# Altium footprint library ICs And Semiconductors THD.PcbLib: 292 footprints (part 1 of 19) (continued)
## APEX_PA94_hflip [mm] "Power SIP, DQ Package Style, Pitch 2.54mm, Reverse Right Angle Formed Original Straight Leads For Flipped  Horizontal Mount" (continued)
Notvisible:
  circle w0.1: c0,21 r2.75
  circle w0.1: c13.97,0 r1
  circle w0.1: c11.43,0 r1
  circle w0.1: c6.35,0 r1
  circle w0.1: c1.27,0 r1
  circle w0.1: c-1.27,0 r1
  circle w0.1: c-3.81,0 r1
  circle w0.1: c-8.89,0 r1
  circle w0.1: c-13.97,0 r1
  lines w0.1: -14.42,0 -13.97,0 -13.97,-0.45 ; -9.34,0 -8.89,0 -8.89,-0.45 ; -4.26,0 -3.81,0 -3.81,-0.45 ; -1.72,0 -1.27,0 -1.27,-0.45 ; -1,21 0,21 0,20 ; 0.82,0 1.27,0 1.27,-0.45 ; 5.9,0 6.35,0 6.35,-0.45 ; 10.98,0 11.43,0 11.43,-0.45 ; 13.52,0 13.97,0 13.97,-0.45
  text "! USED WITH HEAT SINK AND SOCKET !" at -13.97,10.795 h1
Mechanical 14:
  circle w0.3: c13.97,1.905 r0.15
  lines w0.1: -15.24,4.592 -15.24,1.721 -14.605,1.721 ; -14.478,4.592 -14.478,3.423 -14.605,3.017 -14.605,1.226 -14.36,0.981 cw(c-14.719,0.622) -14.211,0.622 -14.211,-0.216 -13.729,-0.216 -13.729,0.622 cw(c-13.221,0.622) -13.58,0.981 -13.335,1.226 -13.335,3.017 -13.462,3.423 -13.462,4.592 ; -13.335,1.721 -9.525,1.721 ; -9.398,4.592 -9.398,3.423 -9.525,3.017 -9.525,1.226 -9.28,0.981 cw(c-9.639,0.622) -9.131,0.622 -9.131,-0.216 -8.649,-0.216 -8.649,0.622 cw(c-8.141,0.622) -8.5,0.981 -8.255,1.226 -8.255,3.017 -8.382,3.423 -8.382,4.592 ; -8.255,1.721 -4.445,1.721 ; -4.318,4.592 -4.318,3.423 -4.445,3.017 -4.445,1.226 -4.2,0.981 cw(c-4.559,0.622) -4.051,0.622 -4.051,-0.216 -3.569,-0.216 -3.569,0.622 cw(c-3.061,0.622) -3.42,0.981 -3.175,1.226 -3.175,3.017 -3.302,3.423 -3.302,4.592 ; -3.175,1.721 -1.905,1.721 ; -1.778,4.592 -1.778,3.423 -1.905,3.017 -1.905,1.226 -1.66,0.981 cw(c-2.019,0.622) -1.511,0.622 -1.511,-0.216 -1.029,-0.216 -1.029,0.622 cw(c-0.521,0.622) -0.88,0.981 -0.635,1.226 -0.635,3.017 -0.762,3.423 -0.762,4.592 ; -0.635,1.721 0.635,1.721 ; 0.762,4.592 0.762,3.423 0.635,3.017 0.635,1.226 0.88,0.981 cw(c0.521,0.622) 1.029,0.622 1.029,-0.216 1.511,-0.216 1.511,0.622 cw(c2.019,0.622) 1.66,0.981 1.905,1.226 1.905,3.017 1.778,3.423 1.778,4.592 ; 1.905,1.721 5.715,1.721 ; 5.842,4.592 5.842,3.423 5.715,3.017 5.715,1.226 5.96,0.981 cw(c5.601,0.622) 6.109,0.622 6.109,-0.216 6.591,-0.216 6.591,0.622 cw(c7.099,0.622) 6.74,0.981 6.985,1.226 6.985,3.017 6.858,3.423 6.858,4.592 ; 6.985,1.721 10.795,1.721 ; 10.922,4.592 10.922,3.423 10.795,3.017 10.795,1.226 11.04,0.981 cw(c10.681,0.622) 11.189,0.622 11.189,-0.216 11.671,-0.216 11.671,0.622 cw(c12.179,0.622) 11.82,0.981 12.065,1.226 12.065,3.017 11.938,3.423 11.938,4.592 ; 12.065,1.721 13.335,1.721 ; 13.462,4.592 13.462,3.423 13.335,3.017 13.335,1.226 13.58,0.981 cw(c13.221,0.622) 13.729,0.622 13.729,-0.216 14.211,-0.216 14.211,0.622 cw(c14.719,0.622) 14.36,0.981 14.605,1.226 14.605,3.017 14.478,3.423 14.478,4.592 ; 14.605,1.721 15.24,1.721 15.24,4.592 ; -15.494,4.592 15.494,4.592 15.494,16.657 14.732,16.657 cw(c14.732,17.419) 13.97,17.419 13.97,17.774 2.535,23.6 ccw(c2.362,23.261) 1.981,23.261 1.981,21 cw(c0,21) -1.981,21 -1.981,23.261 ccw(c-2.362,23.261) -2.535,23.6 -13.97,17.774 -13.97,17.419 cw(c-14.732,17.419) -14.732,16.657 -15.494,16.657 -15.494,4.592 ; 13.093,5.608 13.785,6.878 14.478,5.608 13.093,5.608
3D body "APEX_PA94_hflip.stp": height 7, standoff -2.84, extent -15.494,-0.216 15.494,23.641

## APEX_PA94_v [mm] "Power SIP, DQ Package Style, Pitch 2.54mm, Straight Leads For Vertical Mount"
height 23.14
pads (8):
  round 1.6 hole 0.9: 1(-13.97,0) 2(-11.43,0) 4(-6.35,0) 6(-1.27,0) 7(1.27,0) 8(3.81,0) 10(8.89,0) 12(13.97,0)
Top Overlay:
  circle w0.3: c-13.97,-1.905 r0.15
  lines w0.2: -15.494,1.118 15.494,1.118 ; -15.494,2.134 15.494,2.134 ; -15.24,-2.616 -15.24,-2.87 15.24,-2.87 15.24,-2.616 ; -1.981,2.134 -1.981,3.988 ; 1.981,2.134 1.981,3.988 ; -15.494,-2.616 -15.494,3.988 15.494,3.988 15.494,-2.616 -15.494,-2.616
Notvisible:
  lines w0.1: -14.97,0 -13.97,0 -13.97,-1 ; -14.211,-0.216 -14.211,0.216 ; -13.729,-0.216 -13.729,0.216 ; -12.43,0 -11.43,0 -11.43,-1 ; -11.671,-0.216 -11.671,0.216 ; -11.189,-0.216 -11.189,0.216 ; -7.35,0 -6.35,0 -6.35,-1 ; -6.591,-0.216 -6.591,0.216 ; -6.109,-0.216 -6.109,0.216 ; -2.27,0 -1.27,0 -1.27,-1 ; -1.511,-0.216 -1.511,0.216 ; -1.029,-0.216 -1.029,0.216 ; 0.27,0 1.27,0 1.27,-1 ; 1.029,-0.216 1.029,0.216 ; 1.511,-0.216 1.511,0.216 ; 2.81,0 3.81,0 3.81,-1 ; 3.569,-0.216 3.569,0.216 ; 4.051,-0.216 4.051,0.216 ; 7.89,0 8.89,0 8.89,-1 ; 8.649,-0.216 8.649,0.216 ; 9.131,-0.216 9.131,0.216 ; 12.97,0 13.97,0 13.97,-1 ; 13.729,-0.216 13.729,0.216 ; 14.211,-0.216 14.211,0.216 ; -14.605,-0.216 -14.605,0.216 -13.335,0.216 -13.335,-0.216 -14.605,-0.216 ; -12.065,-0.216 -12.065,0.216 -10.795,0.216 -10.795,-0.216 -12.065,-0.216 ; -6.985,-0.216 -6.985,0.216 -5.715,0.216 -5.715,-0.216 -6.985,-0.216 ; -1.905,-0.216 -1.905,0.216 -0.635,0.216 -0.635,-0.216 -1.905,-0.216 ; 0.635,-0.216 0.635,0.216 1.905,0.216 1.905,-0.216 0.635,-0.216 ; 3.175,-0.216 3.175,0.216 4.445,0.216 4.445,-0.216 3.175,-0.216 ; 8.255,-0.216 8.255,0.216 9.525,0.216 9.525,-0.216 8.255,-0.216 ; 13.335,-0.216 13.335,0.216 14.605,0.216 14.605,-0.216 13.335,-0.216
Mechanical 14:
  circle w0.3: c-13.97,-1.905 r0.15
  lines w0.1: -15.494,1.118 15.494,1.118 ; -15.494,2.134 15.494,2.134 ; -15.24,-2.616 -15.24,-2.87 15.24,-2.87 15.24,-2.616 ; -1.981,2.134 -1.981,3.988 ; 1.981,2.134 1.981,3.988 ; -15.494,-2.616 -15.494,3.988 15.494,3.988 15.494,-2.616 -15.494,-2.616
3D body "APEX_PA94_v.stp": height 23.14, standoff -3.1, extent -15.494,-2.87 15.494,3.988

## CDIP8-300 [mm] "DIP 8 Leads, Row Spacing 7.62 mm; Pitch 2.54 mm"
height 5.08
pads (8):
  rect 1.6x1.6 hole 0.9: 1(-3.81,3.81)
  round 1.6 hole 0.9: 2(-3.81,1.27) 3(-3.81,-1.27) 4(-3.81,-3.81) 5(3.81,-3.81) 6(3.81,-1.27) 7(3.81,1.27) 8(3.81,3.81)
Top Overlay:
  lines w0.2: -0.635,5.15 ccw(c0,5.15) 0.635,5.15 ; -0.635,5.15 ccw(c0,5.15) 0.635,5.15 ; -0.635,5.15 -2.65,5.15 -2.65,-5.15 2.65,-5.15 2.65,5.15 0.635,5.15
Mechanical 14:
  circle w0.1: c-1.905,3.81 r0.254
  lines w0.1: -3.3,-5.15 3.3,-5.15 3.3,5.15 0.635,5.15 cw(c0,5.15) -0.635,5.15 -3.3,5.15 -3.3,-5.15
3D body "CDIP8-300.stp": height 5.34, standoff -5.08, extent -4.04,-5.08 4.04,5.08

## CDIP28-600 [mm] "28 Leads Ceramic Dual In-Line Package Q-28-2, Row Spacing 15.24mm; Pitch 2.54mm"
height 5.59
pads (28):
  rect 1.6x1.6 hole 0.9: 1(-7.62,16.51)
  round 1.6 hole 0.9: 2(-7.62,13.97) 3(-7.62,11.43) 4(-7.62,8.89) 5(-7.62,6.35) 6(-7.62,3.81) 7(-7.62,1.27) 8(-7.62,-1.27) 9(-7.62,-3.81) 10(-7.62,-6.35) 11(-7.62,-8.89) 12(-7.62,-11.43) 13(-7.62,-13.97) 14(-7.62,-16.51) 15(7.62,-16.51) 16(7.62,-13.97) 17(7.62,-11.43) 18(7.62,-8.89) 19(7.62,-6.35) 20(7.62,-3.81) 21(7.62,-1.27) 22(7.62,1.27) 23(7.62,3.81) 24(7.62,6.35) 25(7.62,8.89) 26(7.62,11.43) 27(7.62,13.97) 28(7.62,16.51)
Top Overlay:
  lines w0.2: -6.35,-18.925 -6.35,18.925 -0.635,18.925 ccw(c0,18.925) 0.635,18.925 6.35,18.925 6.35,-18.925 -6.35,-18.925
Mechanical 14:
  lines w0.1: -6.35,-18.925 -6.35,18.925 -0.635,18.925 ccw(c0,18.925) 0.635,18.925 6.35,18.925 6.35,-18.925 -6.35,-18.925
3D body "CERDIP28-600.stp": height 5.72, standoff -5.08, extent -7.85,-18.925 7.85,18.925

## CDIP40-600_WINDOW [mm] "40 Leads Dual In-Line Package, Row Spacing 15.24mm; Pitch 2.54mm"
height 5.72
pads (40):
  rect 1.6x1.6 hole 0.9: 1(-7.62,24.13)
  round 1.6 hole 0.9: 2(-7.62,21.59) 3(-7.62,19.05) 4(-7.62,16.51) 5(-7.62,13.97) 6(-7.62,11.43) 7(-7.62,8.89) 8(-7.62,6.35) 9(-7.62,3.81) 10(-7.62,1.27) 11(-7.62,-1.27) 12(-7.62,-3.81) 13(-7.62,-6.35) 14(-7.62,-8.89) 15(-7.62,-11.43) 16(-7.62,-13.97) 17(-7.62,-16.51) 18(-7.62,-19.05) 19(-7.62,-21.59) 20(-7.62,-24.13) 21(7.62,-24.13) 22(7.62,-21.59) 23(7.62,-19.05) 24(7.62,-16.51) 25(7.62,-13.97) 26(7.62,-11.43) 27(7.62,-8.89) 28(7.62,-6.35) 29(7.62,-3.81) 30(7.62,-1.27) 31(7.62,1.27) 32(7.62,3.81) 33(7.62,6.35) 34(7.62,8.89) 35(7.62,11.43) 36(7.62,13.97) 37(7.62,16.51) 38(7.62,19.05) 39(7.62,21.59) 40(7.62,24.13)
Top Overlay:
  lines w0.2: -6.35,-26.25 6.35,-26.25 6.35,26.25 0.635,26.25 cw(c0,26.25) -0.635,26.25 -6.35,26.25 -6.35,-26.25
Notvisible:
  drawing of 297 lines, arcs and shapes, not listed
Mechanical 14:
  circle w0.1: c-5.715,24.13 r0.5
  lines w0.1: -7.05,-26.25 7.05,-26.25 7.05,26.25 0.635,26.25 cw(c0,26.25) -0.635,26.25 -7.05,26.25 -7.05,-26.25
3D body "CERDIP40-600_WINDOW.stp": height 5.72, standoff -5.08, extent -7.8,-26.25 7.9,26.35

## CELDUC_SKD10306 [mm] "CELDUC SKD Serie, 4 Leads, Body 43.6 x 10.55mm, DC Solid State Relay"
height 25.75
pads (4):
  round 1.9 hole 1.2: 1(13.97,2.54) 2(3.81,2.54) 3(-8.89,2.54) 4(-13.97,2.54)
Top Overlay:
  lines w0.2: -21.8,-5.275 -21.8,5.275 21.8,5.275 21.8,-5.275 -21.8,-5.275
  text "4-" at -14.902,-0.75 h1.5
  text "3+" at -10.085,-0.75 h1.5
  text "2-" at 2.878,-0.75 h1.5
  text "1+" at 12.775,-0.75 h1.5
Notvisible:
  lines w0.1: -14.47,2.54 -13.97,2.54 ; -13.97,2.04 -13.97,2.54 ; -13.97,3.04 -13.97,2.54 ; -13.47,2.54 -13.97,2.54 ; -9.39,2.54 -8.89,2.54 ; -8.89,2.04 -8.89,2.54 ; -8.89,3.04 -8.89,2.54 ; -8.39,2.54 -8.89,2.54 ; -0.5,0 0,0 ; 0,-0.5 0,0 ; 0,0.5 0,0 ; 0.5,0 0,0 ; 3.31,2.54 3.81,2.54 ; 3.81,2.04 3.81,2.54 ; 3.81,3.04 3.81,2.54 ; 4.31,2.54 3.81,2.54 ; 13.47,2.54 13.97,2.54 ; 13.97,2.04 13.97,2.54 ; 13.97,3.04 13.97,2.54 ; 14.47,2.54 13.97,2.54
Mechanical 14:
  lines w0.1: -21.8,-5.275 21.8,-5.275 21.8,5.275 -21.8,5.275 -21.8,-5.275
  text "1+" at 12.775,-0.75 h1.5
  text "2-" at 2.878,-0.75 h1.5
  text "3+" at -10.085,-0.75 h1.5
  text "4-" at -14.902,-0.75 h1.5
3D body "SKD10306.stp": height 25.75, standoff -3.1, extent -21.8,-5.275 21.8,5.275

## CMOSIS_CMV4000 [mm] "Megapixel machine vision CMOS image sensor"
height 3.58
pads (95):
  round 1 hole 0.5 unplated: A2(-4.445,5.715) A3(-4.445,4.445) A4(-4.445,3.175) A5(-4.445,1.905) A6(-4.445,0.635) A7(-4.445,-0.635) A8(-4.445,-1.905) A9(-4.445,-3.175) A10(-4.445,-4.445) A11(-4.445,-5.715) A12(-4.445,-6.985) B1(-3.175,6.985) B2(-3.175,5.715) B3(-3.175,4.445) B4(-3.175,3.175) B5(-3.175,1.905) B6(-3.175,0.635) B7(-3.175,-0.635) B8(-3.175,-1.905) B9(-3.175,-3.175) B10(-3.175,-4.445) B11(-3.175,-5.715) B12(-3.175,-6.985) C1(-1.905,6.985) C2(-1.905,5.715) C3(-1.905,4.445) C4(-1.905,3.175) C5(-1.905,1.905) C6(-1.905,0.635) C7(-1.905,-0.635) C8(-1.905,-1.905) C9(-1.905,-3.175) C10(-1.905,-4.445) C11(-1.905,-5.715) C12(-1.905,-6.985) D1(-0.635,6.985) D2(-0.635,5.715) D3(-0.635,4.445) D4(-0.635,3.175) D5(-0.635,1.905) D6(-0.635,0.635) D7(-0.635,-0.635) D8(-0.635,-1.905) D9(-0.635,-3.175) D10(-0.635,-4.445) D11(-0.635,-5.715) D12(-0.635,-6.985) E1(0.635,6.985) E2(0.635,5.715) E3(0.635,4.445) E4(0.635,3.175) E5(0.635,1.905) E6(0.635,0.635) E7(0.635,-0.635) E8(0.635,-1.905) E9(0.635,-3.175) E10(0.635,-4.445) E11(0.635,-5.715) E12(0.635,-6.985) F1(1.905,6.985) F2(1.905,5.715) F3(1.905,4.445) F4(1.905,3.175) F5(1.905,1.905) F6(1.905,0.635) F7(1.905,-0.635) F8(1.905,-1.905) F9(1.905,-3.175) F10(1.905,-4.445) F11(1.905,-5.715) F12(1.905,-6.985) G1(3.175,6.985) G2(3.175,5.715) G3(3.175,4.445) G4(3.175,3.175) G5(3.175,1.905) G6(3.175,0.635) G7(3.175,-0.635) G8(3.175,-1.905) G9(3.175,-3.175) G10(3.175,-4.445) G11(3.175,-5.715) G12(3.175,-6.985) H1(4.445,6.985) H2(4.445,5.715) H3(4.445,4.445) H4(4.445,3.175) H5(4.445,1.905) H6(4.445,0.635) H7(4.445,-0.635) H8(4.445,-1.905) H9(4.445,-3.175) H10(4.445,-4.445) H11(4.445,-5.715) H12(4.445,-6.985)
Top Overlay:
  lines w0.2: -5.454,-7.275 -6.825,-7.275 cw(c-6.825,-6.775) -7.325,-6.775 -7.325,6.775 cw(c-6.825,6.775) -6.825,7.275 -5.454,7.275 ; 5.454,-7.275 6.825,-7.275 ccw(c6.825,-6.775) 7.325,-6.775 7.325,6.775 ccw(c6.825,6.775) 6.825,7.275 5.454,7.275 ; 5.5,-5.625 6.145,-5.625 6.145,5.635 5.5,5.635 ; -9.325,-8.881 -8.881,-9.325 8.881,-9.325 9.325,-8.881 9.325,8.881 8.881,9.325 -8.881,9.325 -9.325,8.881 -9.325,-8.881 ; -8.075,-7.525 ccw(c-7.575,-7.525) -7.575,-8.025 7.575,-8.025 ccw(c7.575,-7.525) 8.075,-7.525 8.067,7.438 ccw(c7.575,7.525) 7.575,8.025 -7.575,8.025 ccw(c-7.575,7.525) -8.075,7.525 -8.075,-7.525 ; -7.825,6.97 -7.625,6.97 -7.625,7.27 -7.825,7.27 -7.825,6.97
Notvisible:
  drawing of 387 lines, arcs and shapes, not listed
Mechanical 14:
  lines w0.1: -9.325,-8.881 -8.881,-9.325 8.881,-9.325 9.325,-8.881 9.325,8.881 8.881,9.325 -8.881,9.325 -9.325,8.881 -9.325,-8.881 ; -8.075,-7.525 ccw(c-7.575,-7.525) -7.575,-8.025 7.575,-8.025 ccw(c7.575,-7.525) 8.075,-7.525 8.067,7.438 ccw(c7.575,7.525) 7.575,8.025 -7.575,8.025 ccw(c-7.575,7.525) -8.075,7.525 -8.075,-7.525 ; -7.825,6.97 -7.625,6.97 -7.625,7.27 -7.825,7.27 -7.825,6.97 ; -7.325,-6.775 ccw(c-6.825,-6.775) -6.825,-7.275 6.825,-7.275 ccw(c6.825,-6.775) 7.325,-6.775 7.325,6.775 ccw(c6.825,6.775) 6.825,7.275 -6.825,7.275 ccw(c-6.825,6.775) -7.325,6.775 -7.325,-6.775 ; -5.115,-5.625 -5.115,5.635 6.145,5.635 6.145,-5.625 -5.115,-5.625
3D body "CMOSIS_CMV4000.stp": height 3.58, standoff -2.7, extent -9.42,-9.42 9.42,9.42

## CMOSIS_CMV12000 [mm] "12 Megapixel Machine Vision CMOS Image Sensor"
height 3.78
pads (237):
  round 1 hole 0.5: A2(-14.605,17.145) A3(-14.605,15.875) A4(-14.605,14.605) A5(-14.605,13.335) A6(-14.605,12.065) A7(-14.605,10.795) A8(-14.605,9.525) A9(-14.605,8.255) A10(-14.605,6.985) A11(-14.605,5.715) A12(-14.605,4.445) A13(-14.605,3.175) A14(-14.605,1.905) A15(-14.605,0.635) A16(-14.605,-0.635) A17(-14.605,-1.905) A18(-14.605,-3.175) A19(-14.605,-4.445) A20(-14.605,-5.715) A21(-14.605,-6.985) A22(-14.605,-8.255) A23(-14.605,-9.525) A24(-14.605,-10.795) A25(-14.605,-12.065) A26(-14.605,-13.335) A27(-14.605,-14.605) A28(-14.605,-15.875) A29(-14.605,-17.145) A30(-14.605,-18.415) B1(-13.335,18.415) B2(-13.335,17.145) B3(-13.335,15.875) B4(-13.335,14.605) B5(-13.335,13.335) B6(-13.335,12.065) B7(-13.335,10.795) B8(-13.335,9.525) B9(-13.335,8.255) B10(-13.335,6.985) B11(-13.335,5.715) B12(-13.335,4.445) B13(-13.335,3.175) B14(-13.335,1.905) B15(-13.335,0.635) B16(-13.335,-0.635) B17(-13.335,-1.905) B18(-13.335,-3.175) B19(-13.335,-4.445) B20(-13.335,-5.715) B21(-13.335,-6.985) B22(-13.335,-8.255) B24(-13.335,-10.795) B25(-13.335,-12.065) B26(-13.335,-13.335) B27(-13.335,-14.605) B28(-13.335,-15.875) B29(-13.335,-17.145) B30(-13.335,-18.415) C1(-12.065,18.415) C2(-12.065,17.145) C3(-12.065,15.875) C4(-12.065,14.605) C5(-12.065,13.335) C6(-12.065,12.065) C7(-12.065,10.795) C8(-12.065,9.525) C9(-12.065,8.255) C10(-12.065,6.985) C11(-12.065,5.715) C12(-12.065,4.445) C13(-12.065,3.175) C14(-12.065,1.905) C15(-12.065,0.635) C16(-12.065,-0.635) C17(-12.065,-1.905) C18(-12.065,-3.175) C19(-12.065,-4.445) C20(-12.065,-5.715) C21(-12.065,-6.985) C22(-12.065,-8.255) C24(-12.065,-10.795) C25(-12.065,-12.065) C26(-12.065,-13.335) C27(-12.065,-14.605) C28(-12.065,-15.875) C29(-12.065,-17.145) C30(-12.065,-18.415) D1(-10.795,18.415) D2(-10.795,17.145) D3(-10.795,15.875) D4(-10.795,14.605) D5(-10.795,13.335) D6(-10.795,12.065) D7(-10.795,10.795) D8(-10.795,9.525) D9(-10.795,8.255) D10(-10.795,6.985) D11(-10.795,5.715) D12(-10.795,4.445) D13(-10.795,3.175) D14(-10.795,1.905) D15(-10.795,0.635) D16(-10.795,-0.635) D17(-10.795,-1.905) D18(-10.795,-3.175) D19(-10.795,-4.445) D20(-10.795,-5.715) D21(-10.795,-6.985) D22(-10.795,-8.255) D23(-10.795,-9.525) D24(-10.795,-10.795) D25(-10.795,-12.065) D26(-10.795,-13.335) D27(-10.795,-14.605) D28(-10.795,-15.875) D29(-10.795,-17.145) D30(-10.795,-18.415) E1(10.795,18.415) E2(10.795,17.145) E3(10.795,15.875) E4(10.795,14.605) E5(10.795,13.335) E6(10.795,12.065) E7(10.795,10.795) E8(10.795,9.525) E9(10.795,8.255) E10(10.795,6.985) E11(10.795,5.715) E12(10.795,4.445) E13(10.795,3.175) E14(10.795,1.905) E15(10.795,0.635) E16(10.795,-0.635) E17(10.795,-1.905) E18(10.795,-3.175) E19(10.795,-4.445) E20(10.795,-5.715) E21(10.795,-6.985) E22(10.795,-8.255) E23(10.795,-9.525) E24(10.795,-10.795) E25(10.795,-12.065) E26(10.795,-13.335) E27(10.795,-14.605) E28(10.795,-15.875) E29(10.795,-17.145) E30(10.795,-18.415) F1(12.065,18.415) F2(12.065,17.145) F3(12.065,15.875) F4(12.065,14.605) F5(12.065,13.335) F6(12.065,12.065) F7(12.065,10.795) F8(12.065,9.525) F9(12.065,8.255) F10(12.065,6.985) F11(12.065,5.715) F12(12.065,4.445) F13(12.065,3.175) F14(12.065,1.905) F15(12.065,0.635) F16(12.065,-0.635) F17(12.065,-1.905) F18(12.065,-3.175) F19(12.065,-4.445) F20(12.065,-5.715) F21(12.065,-6.985) F22(12.065,-8.255) F23(12.065,-9.525) F24(12.065,-10.795) F25(12.065,-12.065) F26(12.065,-13.335) F27(12.065,-14.605) F28(12.065,-15.875) F29(12.065,-17.145) F30(12.065,-18.415) G1(13.335,18.415) G2(13.335,17.145) G3(13.335,15.875) G4(13.335,14.605) G5(13.335,13.335) G6(13.335,12.065) G7(13.335,10.795) G8(13.335,9.525) G9(13.335,8.255) G10(13.335,6.985) G11(13.335,5.715) G12(13.335,4.445) G13(13.335,3.175) G14(13.335,1.905) G15(13.335,0.635) G16(13.335,-0.635) G17(13.335,-1.905) G18(13.335,-3.175) G19(13.335,-4.445) G20(13.335,-5.715) G21(13.335,-6.985) G22(13.335,-8.255) G23(13.335,-9.525) G24(13.335,-10.795) G25(13.335,-12.065) G26(13.335,-13.335) G27(13.335,-14.605) G28(13.335,-15.875) G29(13.335,-17.145) G30(13.335,-18.415) H1(14.605,18.415) H2(14.605,17.145) H3(14.605,15.875) H4(14.605,14.605) H5(14.605,13.335) H6(14.605,12.065) H7(14.605,10.795) H8(14.605,9.525) H9(14.605,8.255) H10(14.605,6.985) H11(14.605,5.715) H12(14.605,4.445) H13(14.605,3.175) H14(14.605,1.905) H15(14.605,0.635) H16(14.605,-0.635) H17(14.605,-1.905) H18(14.605,-3.175) H19(14.605,-4.445) H20(14.605,-5.715) H21(14.605,-6.985) H22(14.605,-8.255) H23(14.605,-9.525) H24(14.605,-10.795) H25(14.605,-12.065) H26(14.605,-13.335) H27(14.605,-14.605) H28(14.605,-15.875) H29(14.605,-17.145) H30(14.605,-18.415)
Top Overlay:
  circle w0.2: c-14.9,21.5 r0.5
  lines w0.2: -15.505,-16.85 -16.4,-16.85 -16.4,16.85 -15.505,16.85 ; -12.9,-23.5 -12.9,-19.5 -8.9,-19.5 -8.9,-23.5 ; -12.9,23.5 -12.9,19.5 -8.9,19.5 -8.9,23.5 ; -9.895,-16.85 9.895,-16.85 ; -9.895,-14.35 9.895,-14.35 ; -9.895,-13.6 9.895,-13.6 ; -9.895,13.6 9.895,13.6 ; -9.895,14.35 9.895,14.35 ; -9.895,16.85 9.895,16.85 ; 8.9,-23.5 8.9,-19.5 12.9,-19.5 12.9,-23.5 ; 8.9,23.5 8.9,19.5 12.9,19.5 12.9,23.5 ; 15.505,-16.85 16.4,-16.85 16.4,16.85 15.505,16.85 ; -16.9,-23 -16.9,23 -16.4,23.5 -1.75,23.5 -1.75,21.5 ccw(c0,21.5) 1.75,21.5 1.75,23.5 16.4,23.5 16.9,23 16.9,-23 16.4,-23.5 1.75,-23.5 1.75,-21.5 ccw(c0,-21.5) -1.75,-21.5 -1.75,-23.5 -16.4,-23.5 -16.9,-23 ; -9.895,-13.4 9.895,-13.4 -9.895,-13.4 ; -9.895,11.8 9.895,11.8 -9.895,11.8
Notvisible:
  drawing of 960 lines, arcs and shapes, not listed
Mechanical 14:
  circle w0.1: c-14.9,21.5 r0.5
  lines w0.1: -12.9,-23.5 -12.9,-19.5 -8.9,-19.5 -8.9,-23.5 ; -12.9,23.5 -12.9,19.5 -8.9,19.5 -8.9,23.5 ; -12.4,-13.6 -12.4,13.6 ; -0.354,-1.154 0,-0.8 ; -0.354,-0.446 0,-0.8 ; 0.354,-1.154 0,-0.8 ; 0.354,-0.446 0,-0.8 ; 8.9,-23.5 8.9,-19.5 12.9,-19.5 12.9,-23.5 ; 8.9,23.5 8.9,19.5 12.9,19.5 12.9,23.5 ; 12.4,-13.6 12.4,13.6 ; -11.4,-13.4 11.4,-13.4 ; -11.4,-13.4 -11.4,11.8 ; -11.4,-13.4 11.4,-13.4 ; -11.4,-13.4 -11.4,11.8 ; -11.4,11.8 11.4,11.8 ; -11.4,11.8 11.4,11.8 ; 11.4,-13.4 11.4,11.8 ; 11.4,-13.4 11.4,11.8 ; -16.9,-23 -16.9,23 -16.4,23.5 -1.75,23.5 -1.75,21.5 ccw(c0,21.5) 1.75,21.5 1.75,23.5 16.4,23.5 16.9,23 16.9,-23 16.4,-23.5 1.75,-23.5 1.75,-21.5 ccw(c0,-21.5) -1.75,-21.5 -1.75,-23.5 -16.4,-23.5 -16.9,-23 ; -16.4,-16.85 16.4,-16.85 16.4,16.85 -16.4,16.85 -16.4,-16.85 ; -13.9,-14.35 13.9,-14.35 13.9,14.35 -13.9,14.35 -13.9,-14.35 ; -13.15,-13.6 -13.15,13.6 13.15,13.6 13.15,-13.6 -13.15,-13.6
3D body "CMOSIS_CMV12000.stp": height 3.45, standoff -2.5, extent -16.9,-23.5 16.9,23.5

## CMOSIS_CMV20000 [mm] "20 Megapixel Global Shutter CMOS Image Sensor"
height 5.17
pads (143):
  round 1.65 hole 0.8: A2(-19.05,19.05) A3(-19.05,16.51) A4(-19.05,13.97) A5(-19.05,11.43) A6(-19.05,8.89) A7(-19.05,6.35) A8(-19.05,3.81) A9(-19.05,1.27) A10(-19.05,-1.27) A11(-19.05,-3.81) A12(-19.05,-6.35) A13(-19.05,-8.89) A14(-19.05,-11.43) A15(-19.05,-13.97) A16(-19.05,-16.51) A17(-19.05,-19.05) A18(-19.05,-21.59) B1(-16.51,21.59) B2(-16.51,19.05) B3(-16.51,16.51) B4(-16.51,13.97) B5(-16.51,11.43) B6(-16.51,8.89) B7(-16.51,6.35) B8(-16.51,3.81) B9(-16.51,1.27) B10(-16.51,-1.27) B11(-16.51,-3.81) B12(-16.51,-6.35) B13(-16.51,-8.89) B14(-16.51,-11.43) B15(-16.51,-13.97) B16(-16.51,-16.51) B17(-16.51,-19.05) B18(-16.51,-21.59) C1(-13.97,21.59) C2(-13.97,19.05) C3(-13.97,16.51) C16(-13.97,-16.51) C17(-13.97,-19.05) C18(-13.97,-21.59) D1(-11.43,21.59) D2(-11.43,19.05) D3(-11.43,16.51) D16(-11.43,-16.51) D17(-11.43,-19.05) D18(-11.43,-21.59) E1(-8.89,21.59) E2(-8.89,19.05) E3(-8.89,16.51) E16(-8.89,-16.51) E17(-8.89,-19.05) E18(-8.89,-21.59) F1(-6.35,21.59) F2(-6.35,19.05) F3(-6.35,16.51) F16(-6.35,-16.51) F17(-6.35,-19.05) F18(-6.35,-21.59) G1(-3.81,21.59) G2(-3.81,19.05) G3(-3.81,16.51) G16(-3.81,-16.51) G17(-3.81,-19.05) G18(-3.81,-21.59) H1(-1.27,21.59) H2(-1.27,19.05) H3(-1.27,16.51) H16(-1.27,-16.51) H17(-1.27,-19.05) H18(-1.27,-21.59) J1(1.27,21.59) J2(1.27,19.05) J3(1.27,16.51) J16(1.27,-16.51) J17(1.27,-19.05) J18(1.27,-21.59) K1(3.81,21.59) K2(3.81,19.05) K3(3.81,16.51) K16(3.81,-16.51) K17(3.81,-19.05) K18(3.81,-21.59) L1(6.35,21.59) L2(6.35,19.05) L3(6.35,16.51) L16(6.35,-16.51) L17(6.35,-19.05) L18(6.35,-21.59) M1(8.89,21.59) M2(8.89,19.05) M3(8.89,16.51) M16(8.89,-16.51) M17(8.89,-19.05) M18(8.89,-21.59) N1(11.43,21.59) N2(11.43,19.05) N3(11.43,16.51) N16(11.43,-16.51) N17(11.43,-19.05) N18(11.43,-21.59) P1(13.97,21.59) P2(13.97,19.05) P3(13.97,16.51) P16(13.97,-16.51) P17(13.97,-19.05) P18(13.97,-21.59) R1(16.51,21.59) R2(16.51,19.05) R3(16.51,16.51) R4(16.51,13.97) R5(16.51,11.43) R6(16.51,8.89) R7(16.51,6.35) R8(16.51,3.81) R9(16.51,1.27) R10(16.51,-1.27) R11(16.51,-3.81) R12(16.51,-6.35) R13(16.51,-8.89) R14(16.51,-11.43) R15(16.51,-13.97) R16(16.51,-16.51) R17(16.51,-19.05) R18(16.51,-21.59) T1(19.05,21.59) T2(19.05,19.05) T3(19.05,16.51) T4(19.05,13.97) T5(19.05,11.43) T6(19.05,8.89) T7(19.05,6.35) T8(19.05,3.81) T9(19.05,1.27) T10(19.05,-1.27) T11(19.05,-3.81) T12(19.05,-6.35) T13(19.05,-8.89) T14(19.05,-11.43) T15(19.05,-13.97) T16(19.05,-16.51) T17(19.05,-19.05) T18(19.05,-21.59)
Top Overlay:
  circle w0.1: c-23.95,25.363 r0.5
  lines w0.2: -25.95,-19 -20.275,-19 ; -25.95,-9 -20.275,-9 ; -25.95,9 -20.275,9 ; -25.95,19 -20.275,19 ; -19.1,-22.814 -19.1,-23.2 19.1,-23.2 19.1,-22.814 ; -19.1,20.45 -19.1,23.2 19.1,23.2 19.1,22.814 ; -12.29,-15.638 -12.29,15.638 ; 12.29,-15.638 12.29,15.638 ; 20.275,-19 25.95,-19 ; 20.275,-9 25.95,-9 ; 20.275,2.05 25.95,2.05 ; 20.275,12.05 25.95,12.05 ; -25.95,-24.05 25.95,-24.05 25.95,-15.75 23.95,-15.75 cw(c23.95,-14) 23.95,-12.25 25.95,-12.25 25.95,5.3 23.95,5.3 cw(c23.95,7.05) 23.95,8.8 25.95,8.8 25.95,24.05 -25.95,24.05 -25.95,15.75 -23.95,15.75 cw(c-23.95,14) -23.95,12.25 -25.95,12.25 -25.95,-12.25 -23.95,-12.25 cw(c-23.95,-14) -23.95,-15.75 -25.95,-15.75 -25.95,-24.05
Notvisible:
  drawing of 597 lines, arcs and shapes, not listed
Mechanical 14:
  circle w0.1: c-23.95,21.525 r0.5
  lines w0.1: -25.95,-19 -19.95,-19 -19.95,-9 -25.95,-9 ; -25.95,9 -19.95,9 -19.95,19 -25.95,19 ; 25.95,-19 19.95,-19 19.95,-9 25.95,-9 ; 25.95,2.05 19.95,2.05 19.95,12.05 25.95,12.05 ; -25.95,-24.05 25.95,-24.05 25.95,-15.75 23.95,-15.75 cw(c23.95,-14) 23.95,-12.25 25.95,-12.25 25.95,5.3 23.95,5.3 cw(c23.95,7.05) 23.95,8.8 25.95,8.8 25.95,24.05 -25.95,24.05 -25.95,15.75 -23.95,15.75 cw(c-23.95,14) -23.95,12.25 -25.95,12.25 -25.95,-12.25 -23.95,-12.25 cw(c-23.95,-14) -23.95,-15.75 -25.95,-15.75 -25.95,-24.05 ; -19.1,-23.2 19.1,-23.2 19.1,23.2 -19.1,23.2 -19.1,-23.2 ; -16.2,-20.3 -16.2,20.3 16.2,20.3 16.2,-20.3 -16.2,-20.3 ; -15.45,-19.55 15.45,-19.55 15.45,19.55 -15.45,19.55 -15.45,-19.55 ; -12.29,-16.385 12.29,-16.385 12.29,16.385 -12.29,16.385 -12.29,-16.385
3D body "CMV20000.stp": height 4.72, standoff -3.3, extent -25.95,-24.05 25.95,24.05